# Altium footprint library d1_PcbLib.PcbLib: 266 footprints (part 12 of 17)
Each footprint in its own frame and in the unit in brackets; x right, y up, seen from the top. Pads: shape width x height; smd on the part's side, far side on the other; paste and mask are expansions set on the pad; w line width, h text height; cw(c..) or ccw(c..) is an arc to the next point about the centre after c.
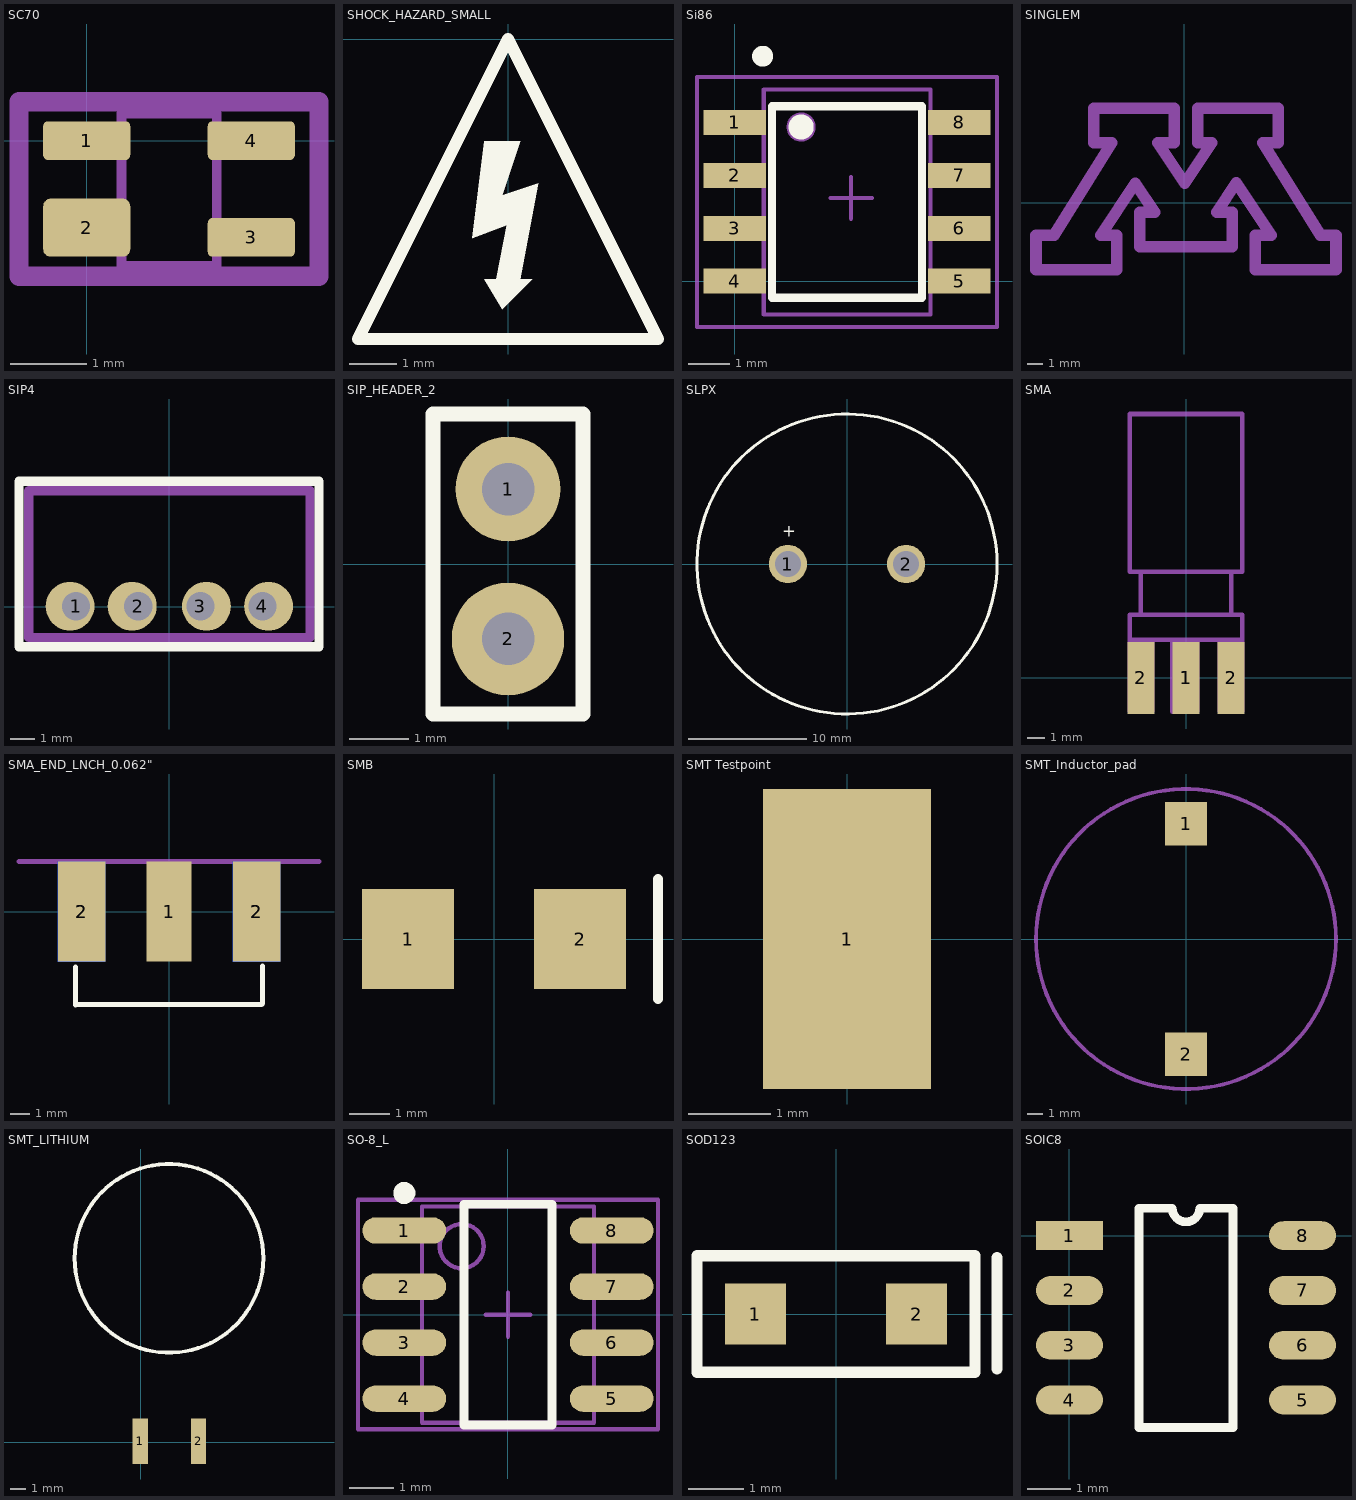
[diagram p11: the footprints below, top view; thin cyan lines are the x and y axes]

## SC70 [mil]
pads (4):
  rrect25% 45x20 smd: 1(0,0) 3(85,-50) 4(85,0)
  rrect25% 45x30 smd: 2(0,-45)
Mechanical 13:
  lines w5: 18,-64.74 18,14 67.21,14 67.21,-64.74 18,-64.74
Mechanical 15:
  lines w10: -35,-70 -35,20 120,20 120,-70 -35,-70
3D body: height 42.69, standoff -0.62, extent -1,-64.37 85.61,14.37

## SHOCK_HAZARD_SMALL [mm]
Top Overlay:
  region: -0.508,-2.159 -0.762,-4.216 -0.025,-3.937 -0.254,-5.08 -0.508,-5.08 -0.127,-5.715 0.508,-5.08 0.254,-5.08 0.635,-3.048 -0.127,-3.302 0.254,-2.159
  lines w0.254: -3.175,-6.35 0,0 3.175,-6.35 -3.175,-6.35

## Si86 [mm]
height 1.5
pads (8):
  rect 1.5x0.6 smd: 1(0,3.81) 2(0,2.54) 3(0,1.27) 4(0,0) 5(5.4,0) 6(5.4,1.27) 7(5.4,2.54) 8(5.4,3.81)
Top Overlay:
  circle w0.25: c0.675,5.4 r0.125
  circle w0.3: c1.6,3.7 r0.15
  lines w0.2: 0.9,-0.4 0.9,4.2 4.5,4.2 4.5,-0.4 0.9,-0.4
Mechanical 13:
  circle w0.1: c1.6,3.7 r0.3
  lines w0.1: 0.7,-0.8 0.7,4.6 4.7,4.6 4.7,-0.8 0.7,-0.8
Mechanical 15:
  lines w0.1: 2.3,2 3.3,2 ; 2.8,1.5 2.8,2.5 ; -0.9,-1.1 -0.9,4.9 6.3,4.9 6.3,-1.1 -0.9,-1.1
3D body: height 1.5, standoff 0.2, extent 0.7,-0.8 4.7,4.6

## SINGLEM [mm]
Top Solder:
  lines w0.762: -9.779,-4.42 -4.445,-4.42 -4.445,-2.134 -5.503,-2.134 -3.217,1.295 -1.947,-0.61 -2.921,-0.61 -2.921,-2.896 3.175,-2.896 3.175,-0.61 2.159,-0.61 3.45,1.327 5.757,-2.134 4.699,-2.134 4.699,-4.42 10.033,-4.42 10.033,-2.134 9.001,-2.134 5.191,3.962 6.223,3.962 6.223,6.248 0.889,6.248 0.889,3.962 1.82,3.962 0.042,1.295 -1.736,3.962 -0.635,3.962 -0.635,6.248 -5.969,6.248 -5.969,3.962 -4.778,3.962 -8.588,-2.134 -9.779,-2.134 -9.779,-4.42

## SIP4 [mm]
pads (4):
  round 2 hole 1.15 copper offset -0.25,0: 1(-3.81,0.025) 2(-1.27,0.025)
  round 2 hole 1.15 copper offset 0.25,0: 3(1.27,0.025) 4(3.81,0.025)
Top Overlay:
  lines w0.381: -6.147,-1.626 -6.147,5.131 6.121,5.131 6.121,-1.626 -6.147,-1.626
Mechanical 15:
  lines w0.381: -5.75,-1.25 -5.75,4.75 5.75,4.75 5.75,-1.25 -5.75,-1.25
3D body: height 10, standoff 0, extent -5.74,-1.245 5.74,4.75

## SIP_HEADER_2 [mil] "2 Pin SIP Header"
pads (2):
  round 70 hole 35: 1(0,50)
  round 75 hole 35: 2(0,-50)
Top Overlay:
  lines w10: -50,-100 50,-100 50,100 -50,100 -50,-100
3D body: height 170.28, standoff -118.11, extent -49,-99.5 276.59,100.5

## SLPX [mm]
pads (2):
  round 3.25 hole 2.2: 1(-5,0) 2(5,0)
Top Overlay:
  circle w0.254: c0,0 r12.7
  text "+" at -5.5,2.3 h1.02

## SMA [mil]
pads (4):
  rect 60x160 smd: 1(0,0) 1(0,0) 2(-100,0) 2(100,0)
Mechanical 1:
  lines w10: -100,140 -100,235 ; -75,85 -75,-75 -125,-75 -125,85 ; -30,85 -30,-75 25,-75 25,85 ; 75,85 75,-75 125,-75 125,85 ; 100,140 100,235 ; -125,85 -125,140 125,140 125,85 ; -125,85 125,85 ; -100,235 -125,235 -125,585 125,585 125,235 100,235 ; -100,235 100,235
3D body: height 30, standoff 0, extent -29.98,-74.98 24.98,84.98
3D body: height 40, standoff -110, extent 75.02,-74.98 124.98,84.98
3D body: height 40, standoff -110, extent -124.98,-74.98 -75.02,84.98
3D body: height 140, standoff -110, extent -124.98,85.02 124.98,139.98
3D body: height 120, standoff -90, extent -99.98,140.02 99.98,234.98
3D body: height 140, standoff -110, extent -124.98,235.02 124.98,584.98

## SMA_END_LNCH_0.062" [mil] "End Launch SMA CXN for 0.062\" boards"
pads (5):
  rect 90x200 smd: 1(0,0)
  rect 95x200 smd: 2(-175,0) 2(175,0)
  rect 95x200 smd far side: 2(-175,0) 2(175,0)
Top Overlay:
  lines w10: -187.5,-111 -187.5,-186.5 -187,-186 185,-186 187,-184 187,-119 ; 187,-123 187,-109
Bottom Overlay:
  lines w10: -240,90 -240,-200 -230,-210 230,-210 240,-200 240,90 ; -187,-188 -187,-109 ; -185,-188 185,-188 187,-186 187,-108
Mechanical 1:
  lines w10: -300,100 300,100
3D body: height 170.51, standoff -141.3, extent -190,-80 184.8,481.81

## SMB [mm]
pads (2):
  rect 2.3x2.5 smd: 1(-2.15,0) 2(2.15,0)
Top Overlay:
  lines w0.254: 4.1,-1.5 4.1,1.5

## SMT Testpoint [mm]
pads (1):
  rect 2.05x3.65 smd: 1(0,0)

## SMT_Inductor_pad [mm]
pads (2):
  rect 2.79x2.92 smd: 1(0,7.685) 2(0,-7.685)
Mechanical 13:
  circle w0.254: c0,0 r10

## SMT_LITHIUM [mm]
height 3.1
pads (2):
  rect 1x3 smd: 1(-0.025,0.076) 2(3.835,0.076)
Top Overlay:
  circle w0.254: c1.881,12.192 r6.247

## SO-8_L [mm] "8-Pin Plastic Small Outline Integrated Circuit 1.27 mm Pitch, IPC High Density"
height 1.75
pads (8):
  oval 1.9x0.6 smd: 1(-2.35,1.905) 2(-2.35,0.635) 3(-2.35,-0.635) 4(-2.35,-1.905) 5(2.35,-1.905) 6(2.35,-0.635) 7(2.35,0.635) 8(2.35,1.905)
Top Overlay:
  circle w0.25: c-2.35,2.755 r0.125
  lines w0.2: -1,-2.5 -1,2.5 1,2.5 1,-2.5 -1,-2.5
Mechanical 13:
  circle w0.1: c-1.05,1.55 r0.5
  lines w0.1: -1.95,-2.45 -1.95,2.45 1.95,2.45 1.95,-2.45 -1.95,-2.45
Mechanical 15:
  lines w0.1: -0.5,0 0.5,0 ; 0,-0.5 0,0.5 ; -3.4,-2.6 -3.4,2.6 3.4,2.6 3.4,-2.6 -3.4,-2.6
3D body: height 1.55, standoff 0, extent -3.023,-2.464 2.977,2.479

## SOD123 [mm]
pads (2):
  rect 1.1x1.1 smd: 1(-1.45,0) 2(1.45,0)
Top Overlay:
  lines w0.203: 2.896,-0.991 2.896,1.016 ; -2.5,-1.05 2.5,-1.05 2.5,1.05 -2.5,1.05 -2.5,0 -2.5,-1.05

## SOIC8 [mm]
pads (8):
  rect 1.55x0.67 smd: 1(0,0)
  oval 1.55x0.67 smd: 2(0,-1.27) 3(0,-2.54) 4(0,-3.81) 5(5.4,-3.81) 6(5.4,-2.54) 7(5.4,-1.27) 8(5.4,0)
Top Overlay:
  lines w0.2: 1.61,-4.445 1.61,0.635 2.382,0.635 ccw(c2.7,0.635) 3.017,0.635 3.79,0.635 3.79,-4.445 1.61,-4.445